# Altium footprint library syhaunguyen.PcbLib: 349 footprints (part 11 of 22)
Each footprint in its own frame and in the unit in brackets; x right, y up, seen from the top. Pads: shape width x height; smd on the part's side, far side on the other; paste and mask are expansions set on the pad; w line width, h text height; cw(c..) or ccw(c..) is an arc to the next point about the centre after c.
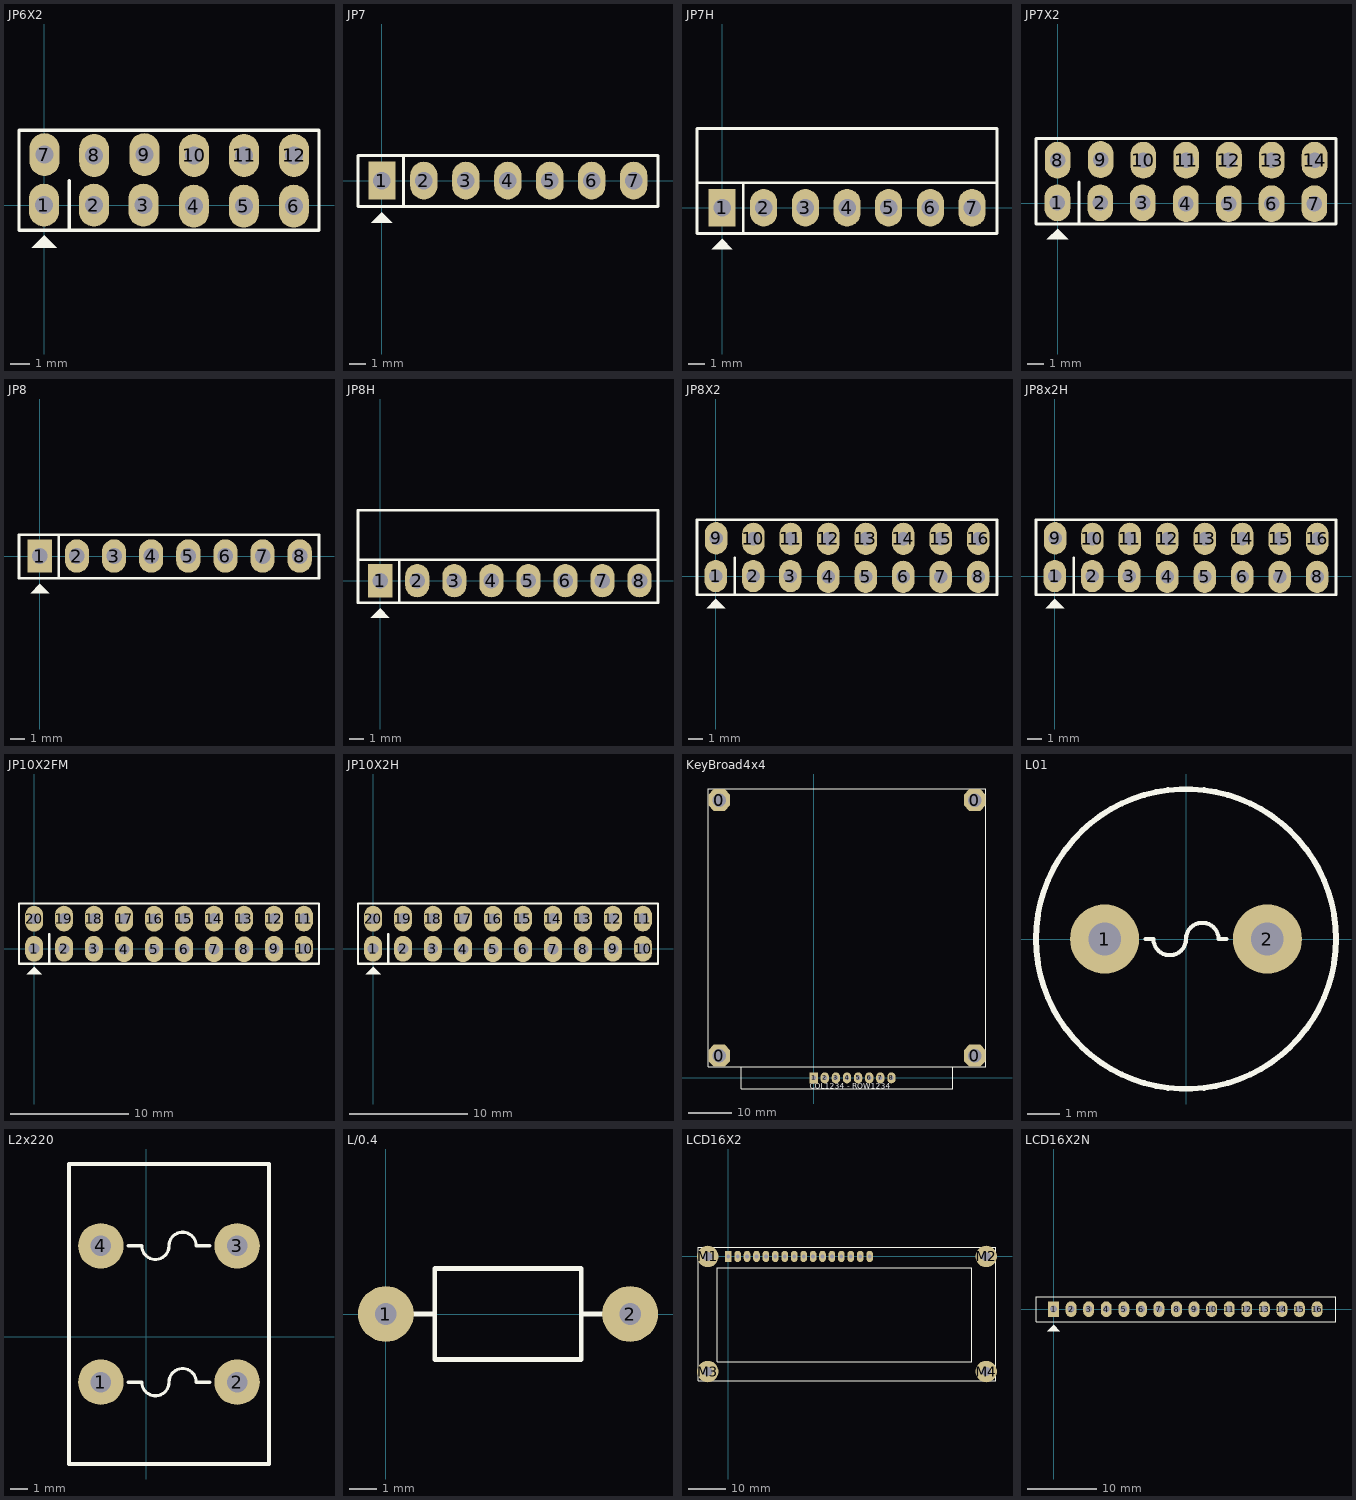
[diagram p10: the footprints below, top view; thin cyan lines are the x and y axes]

## JP6X2 [mil]
pads (12):
  oval 60x86 hole 36: 1(-0.5,0.5) 2(99.5,0.5) 3(198.5,0.5) 4(299.5,-1.5) 5(399.5,-1.5) 6(499.5,-1.5) 7(0.5,101.5) 8(100,100) 9(200.5,101.5) 10(300,100) 11(400,100) 12(500,100)
Top Overlay:
  region: 0,-60 -25,-85 25,-85
  lines w7: 50,-49 50,49 ; -50.5,-49.5 550,-49.5 550,150.5 -50.5,150.5 -50.5,50.5 -50.5,-49.5
3D body: height 335.24, standoff -117.51, extent -49.99,-49.99 550.01,150.01

## JP7 [mil] "JP7"
height 200
pads (7):
  rect 65x90 hole 42: 1(0,0)
  oval 65x90 hole 42: 2(100,0) 3(200,0) 4(300,0) 5(400,0) 6(500,0) 7(600,0)
Top Overlay:
  region: 0,-75 -25,-100 25,-100
  lines w7: 51,-58 51,60 ; -57,-62 658,-62 658,60 -57,60 -57,-62
3D body: height 323.44, standoff -117.51, extent -50,-49.21 646.06,49.21

## JP7H [mil]
pads (7):
  rect 65x90 hole 42: 1(0,0)
  oval 65x90 hole 42: 2(100,0) 3(200,0) 4(300,0) 5(400,0) 6(500,0) 7(600,0)
Top Overlay:
  region: 0,-75 -25,-100 25,-100
  lines w7: -57,60 660,60 ; -50,60 -60,60 ; 51,-58 51,60 ; -60,60 -60,190 660,190 660,60 ; -60,60 -60,-62 660,-62 660,60
3D body: height 99.03, standoff -93.89, extent -46.06,-24.96 646.07,413.63

## JP7X2 [mil]
pads (14):
  oval 60x86 hole 36: 1(-0.5,0.5) 2(99.5,0.5) 3(198.5,0.5) 4(299.5,-1.5) 5(399.5,-1.5) 6(499.5,-1.5) 7(599.5,-1.5) 8(0,100) 9(100.5,101.5) 10(200,100) 11(300,100) 12(400,100) 13(500,100) 14(600,100)
Top Overlay:
  region: 0,-60 -25,-85 25,-85
  lines w7: 50,-49 50,49 ; -50.5,-49.5 -50.5,50.5 -50.5,150.5 650,150.5 650,-49.5 -50.5,-49.5
3D body: height 335.25, standoff -117.51, extent -49.99,-49.99 650.01,150.01

## JP8 [mil] "JP8"
height 200
pads (8):
  rect 65x90 hole 42: 1(0,0)
  oval 65x90 hole 42: 2(100,0) 3(200,0) 4(300,0) 5(400,0) 6(500,0) 7(600,0) 8(700,0)
Top Overlay:
  region: 0,-75 -25,-100 25,-100
  lines w7: 51,-60 51,56 ; -56,-60 752,-60 752,57 -56,57 -56,-60
3D body: height 323.43, standoff -117.51, extent -48.03,-50 748.03,48.43

## JP8H [mil]
pads (8):
  rect 65x90 hole 42: 1(0,0)
  oval 65x90 hole 42: 2(100,0) 3(200,0) 4(300,0) 5(400,0) 6(500,0) 7(600,0) 8(700,0)
Top Overlay:
  region: 0,-75 -25,-100 25,-100
  lines w7: 51,-60 51,56 ; -60,57 -60,-60 750,-60 750,57 ; -60,57 750,57 ; -60,57 -60,190 750,190 750,57
3D body: height 49.21, standoff -143.7, extent -46.06,-14.96 746.06,423.62

## JP8X2 [mil]
pads (16):
  oval 60x86 hole 36: 1(-0.5,0.5) 2(99.5,0.5) 3(198.5,0.5) 4(299.5,-1.5) 5(399.5,-1.5) 6(499.5,-1.5) 7(599.5,-1.5) 8(699.5,-1.5) 9(0.5,101.5) 10(100,100) 11(200,100) 12(300,100) 13(400,100) 14(500,100) 15(600,100) 16(700,100)
Top Overlay:
  region: 0,-60 -25,-85 25,-85
  lines w7: 50,-49 50,49 ; -50.5,-49.5 -50.5,50.5 -50.5,150.5 750,150.5 750,-49.5 -50.5,-49.5
3D body: height 335.25, standoff -117.51, extent -49.99,-49.99 750.01,150.01

## JP8x2H [mil]
pads (16):
  oval 60x86 hole 36: 1(0,0) 2(100,0) 3(199,0) 4(300,-2) 5(400,-2) 6(500,-2) 7(600,-2) 8(700,-2) 9(1,101) 10(100.5,99.5) 11(200.5,99.5) 12(300.5,99.5) 13(400.5,99.5) 14(500.5,99.5) 15(600.5,99.5) 16(700.5,99.5)
Top Overlay:
  region: 0.5,-60.5 -24.5,-85.5 25.5,-85.5
  lines w7: 50.5,-49.5 50.5,48.5 ; -50,-50 750.5,-50 750.5,150 -50,150 -50,50 -50,-50
3D body: height 197.45, standoff -117.51, extent -50,-13.44 750,493.65

## JP10X2FM [mil]
pads (20):
  oval 60x86 hole 36: 1(0,0) 2(100,0) 3(199,0) 4(300,-2) 5(400,-2) 6(500,-2) 7(600,-2) 8(700,-2) 9(800,0) 10(900,0) 11(899.5,100.5) 12(799.5,100.5) 13(699.5,100.5) 14(599.5,100.5) 15(499.5,100.5) 16(400,100) 17(300,100) 18(199.5,100.5) 19(99.5,100.5) 20(0,100)
Top Overlay:
  region: 0.5,-60.5 -24.5,-85.5 25.5,-85.5
  lines w7: -50.5,150.5 949.5,150.5 ; -50,150 -50,50 -50,-50 950,-50 950,150 ; 50.5,-49.5 50.5,48.5
3D body: height 335.25, standoff -125.38, extent -54.92,-48.43 954.92,148.43

## JP10X2H [mil]
pads (20):
  oval 60x86 hole 36: 1(0,0) 2(100,0) 3(199,0) 4(300,-2) 5(400,-2) 6(500,-2) 7(600,-2) 8(700,-2) 9(800,0) 10(900,0) 11(899.5,100.5) 12(799.5,100.5) 13(699.5,100.5) 14(599.5,100.5) 15(499.5,100.5) 16(400,100) 17(300,100) 18(199.5,100.5) 19(99.5,100.5) 20(0,100)
Top Overlay:
  region: 0.5,-60.5 -24.5,-85.5 25.5,-85.5
  lines w7: -50.5,150.5 949.5,150.5 ; -50,150 -50,50 -50,-50 950,-50 950,150 ; 50.5,-49.5 50.5,48.5
3D body: height 197.45, standoff -117.51, extent -50,-12.44 950,494.65

## KeyBroad4x4 [mm] "KeyBroad 4x4"
height 5.08
pads (12):
  oct 5x5 hole 3.048: 0(-21.59,5.08) 0(-21.59,63.5) 0(36.83,5.08) 0(36.83,63.5)
  rect 1.905x2.5 hole 1: 1(0,0)
  oval 1.905x2.5 hole 1: 2(2.54,0) 3(5.08,0) 4(7.62,0) 5(10.16,0) 6(12.7,0) 7(15.24,0) 8(17.78,0)
Top Overlay:
  lines w0.203: -16.51,2.54 -16.51,-2.515 -16.535,-2.54 31.75,-2.54 31.75,2.489 ; -24.13,2.54 39.37,2.54 39.37,66.04 -24.13,66.04 -24.13,2.54
  text "COL1234 - ROW1234" at -0.889,-2.464 h1.27

## L01 [mil] "Inductor"
pads (2):
  round 85 hole 40: 1(-100,0) 2(100,0)
Top Overlay:
  circle w7: c0,0 r184.39
  lines w5: -50,0 -40,0 ccw(c-20,0) 0,0 cw(c20,0) 40,0 50,0

## L2x220 [mil] "Loc 220"
pads (4):
  round 100 hole 45: 1(-100,-100) 2(200,-100) 3(200,200) 4(-100,200)
Top Overlay:
  lines w7: -10,-100 ccw(c20,-100) 50,-100 cw(c80,-100) 110,-100 ; -10,200 ccw(c20,200) 50,200 cw(c80,200) 110,200
  lines w8: -40,-100 -10,-100 ; -40,200 -10,200 ; 110,-100 140,-100 ; 110,200 140,200 ; -170,-280 270,-280 270,380 -170,380 -170,-280

## L/0.4 [mil] "Inductor , 2 Pin, L 350mil, W 150 mil"
height 150
pads (2):
  round 80 hole 31: 1(0,0) 2(350,0)
Top Overlay:
  lines w7: 70,0 40,0 70,0 ; 70,0 70,-65 280,-65 280,0 ; 70,0 70,65 280,65 280,0 ; 280,0 310,0 280,0

## LCD16X2 [mm] "LCD dipslay 16x2, 16 pin"
height 10.16
pads (20):
  rect 1.778x3.048 hole 1: 1(0,0)
  oval 1.778x3.048 hole 1: 2(2.54,0) 3(5.08,0) 4(7.62,0) 5(10.16,0) 6(12.7,0) 7(15.24,0) 8(17.78,0) 9(20.32,0) 10(22.86,0) 11(25.4,0) 12(27.94,0) 13(30.48,0) 14(33.02,0) 15(35.56,0) 16(38.1,0)
  round 5.8 / inner round 0 / far side round 0 hole 2.5 unplated: M1(-5.5,0) M2(69.5,0) M3(-5.5,-31) M4(69.5,-31)
Top Overlay:
  lines w0.2: -8,-33.5 72,-33.5 72,2.5 -8,2.5 -8,-33.5 ; -2.921,-28.423 65.659,-28.423 65.659,-3.023 -2.921,-3.023 -2.921,-28.423
3D body: height 18.14, standoff 4.93, extent -8.128,-34.468 72.372,2.032
3D body: height 11.89, standoff -0.51, extent -1.219,-1.321 39.321,1.179
3D body: height 7.02, standoff -2.98, extent -1.207,-1.333 39.433,1.207

## LCD16X2N [mil] "LCD dipslay 16x2, 16 pin"
height 400
pads (16):
  rect 62x90 hole 39: 1(0,0)
  oval 62x90 hole 39: 2(100,0) 3(200,0) 4(300,0) 5(400,0) 6(500,0) 7(600,0) 8(700,0) 9(800,0) 10(900,0) 11(1000,0) 12(1100,0) 13(1200,0) 14(1300,0) 15(1400,0) 16(1500,0)
Top Overlay:
  region: 0,-90 -35,-125 35,-125
  lines w7: -100,-71 -100,70 1608,70 1608,-71 -100,-71
3D body: height 276.19, standoff -117.51, extent -49,-49 1551,51
3D body: height 468.11, standoff -20.08, extent -48.03,-48.43 1548.03,50
3D body: height 764, standoff 244, extent -319.64,-1353.49 2849.65,83.51